# Altium integrated library Free Documents.IntLib: 42 symbols
Pins are listed as number, name and electrical type; pins without a type are passive.

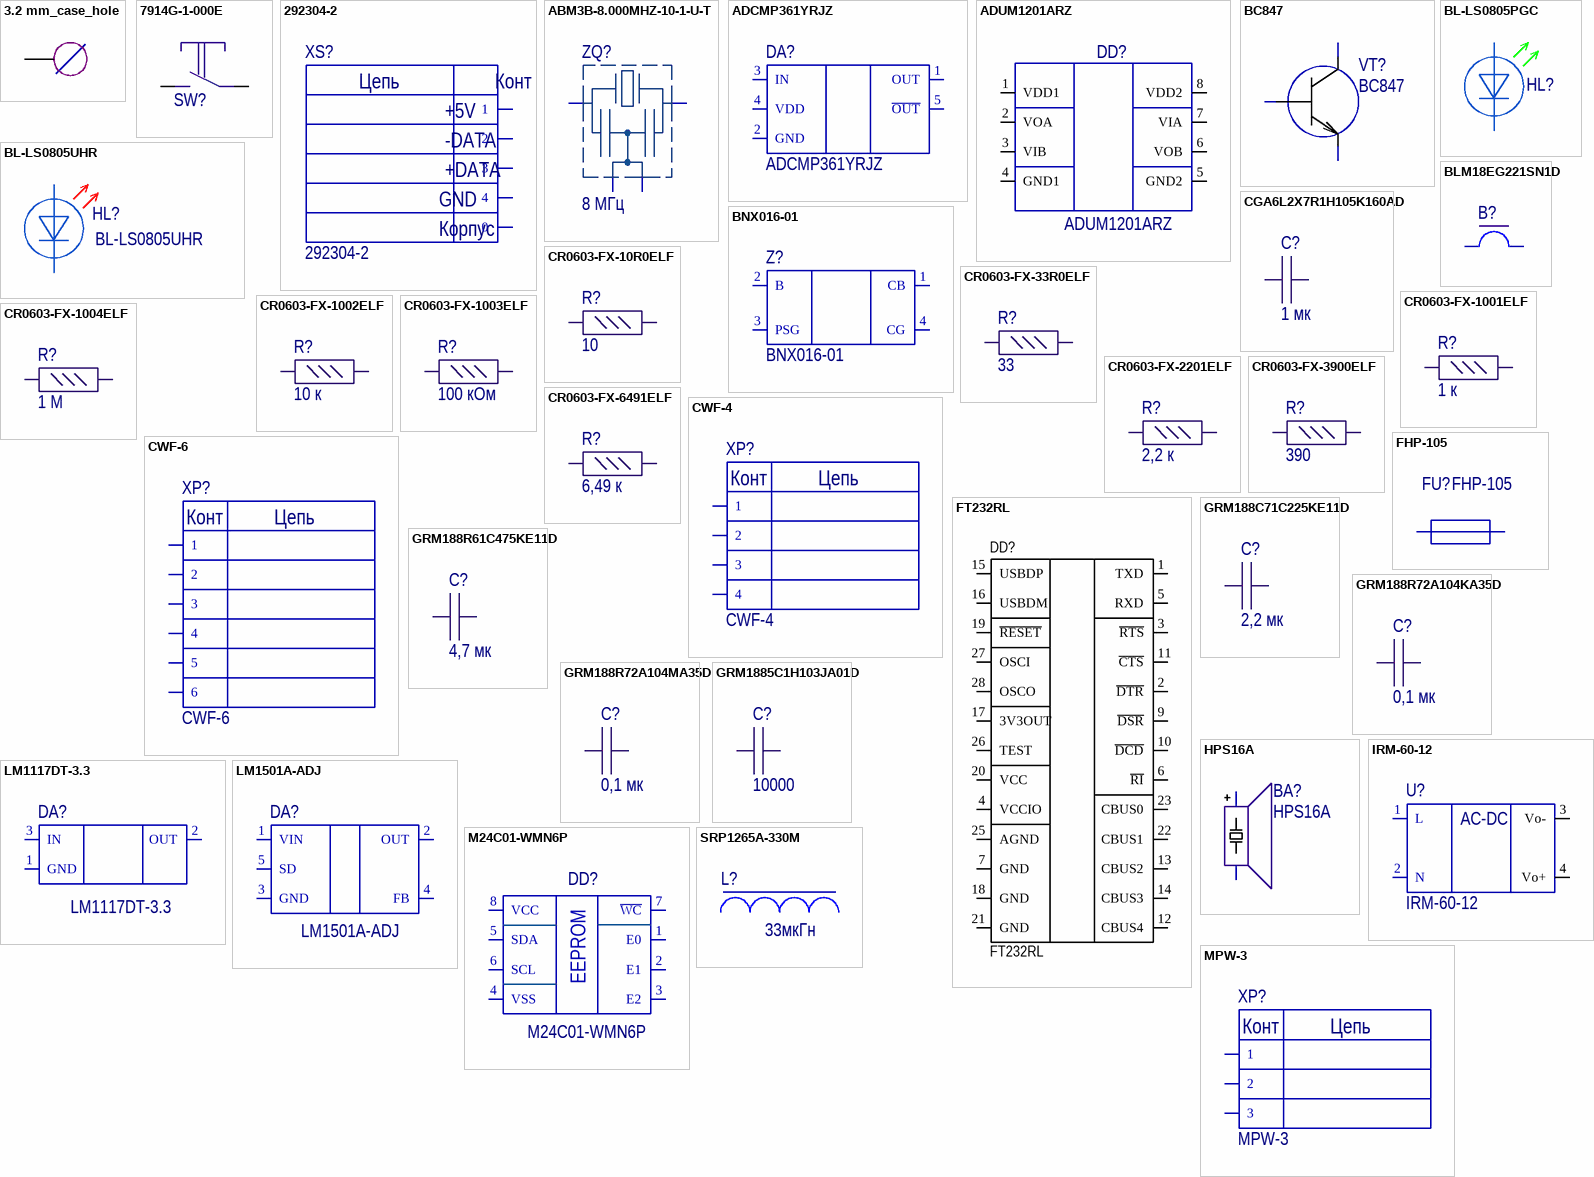
[diagram p0: symbols 3.2 mm_case_hole to SRP1265A-330M]

## 3.2 mm_case_hole
designator X?  (value not drawn)
footprint 3.2_Round_hole
pins: CASE

## 7914G-1-000E
designator SW?  (value not drawn)
Тактовый переключатель SMD
footprint 7914G
pins: 1, 2

## 292304-2
designator XS?
footprint USB-B
pins: 0, 1, 2, 3, 4
text: Цепь; Конт; +5V; -DATA; +DATA; GND; Корпус

## ABM3B-8.000MHZ-10-1-U-T
designator ZQ?, comment 8 МГц
footprint MJ CRYSTAL
pins: 1, 2, 3, 4

## ADCMP361YRJZ
designator DA?
GENERAL PURPOSE COMPARATOR
footprint SOT-23-5 (SOT23, 5-Leads, Body 2,90x2,80mm, Pitch 0,95mm, IPC Medium Density)
pins: 1 OUT, 2 GND, 3 IN, 4 VDD, 5 ~{OUT}

## ADUM1201ARZ
designator DD?
Двухканальный цифровой изолятор
footprint SO-8 (SOIC, 8-Leads, Body 4,90x3,90mm, Pitch 1,27mm, IPC Medium Density)
pins: 1 VDD1, 2 VOA, 3 VIB, 4 GND1, 5 GND2, 6 VOB, 7 VIA, 8 VDD2

## BC847
designator VT?
footprint SOT23 (SOT23, 3-Leads, Body 2,90x2,45mm, Pitch 0,95mm, IPC Medium Density)
pins: 1 B, 2 E, 3 C

## BL-LS0805PGC
designator HL?  (value not drawn)
footprint LED_0805_GREEN
pins: 1, 2

## BL-LS0805UHR
designator HL?
footprint LED_0805_RED
pins: 1, 2

## BLM18EG221SN1D
designator B?, comment 220 Ом  (value not drawn)
footprint BLM18
pins: 1, 2

## BNX016-01
designator Z?
25В 15А 40дБ, LC фильтр
footprint BNX01
pins: 1 CB, 2 B, 3 PSG, 4 CG

## CGA6L2X7R1H105K160AD
designator C?, comment 1 мк
CAP CER 1UF 50V X7R 1210 EPOXY; Part Number: CGA6L2X7R1H105K160AD; Manufacturer: TDK Corporation; Value: 1 мк; ComponentLink1URL: https://product.tdk.com/info/en/catalog/datasheets/mlcc_automotive_epoxy_en.pdf?ref_disty=digikey; ComponentLink1Description: Datasheet; Component Type: Capasitor
footprint C_1210
pins: 1, 2

## CR0603-FX-10R0ELF
designator R?, comment 10
RES SMD 10 OHM 1% 1/10W 0603; Part Number: CR0603-FX-10R0ELF; Manufacturer: Bourns Inc.; Value: 10; ComponentLink1URL: https://www.bourns.com/pdfs/chpreztr.pdf; ComponentLink1Description: Datasheet; Component Type: Resistor
footprint R_0603
pins: 1, 2

## CR0603-FX-33R0ELF
designator R?, comment 33
RES SMD 33 OHM 1% 1/10W 0603; Part Number: CR0603-FX-33R0ELF; Manufacturer: Bourns Inc.; Value: 33; ComponentLink1URL: https://www.bourns.com/pdfs/chpreztr.pdf; ComponentLink1Description: Datasheet; Component Type: Resistor
footprint R_0603
pins: 1, 2

## CR0603-FX-1001ELF
designator R?, comment 1 к
RES SMD 1K OHM 1% 1/10W 0603; Part Number: CR0603-FX-1001ELF; Manufacturer: Bourns Inc.; Value: 1 к; ComponentLink1URL: https://www.bourns.com/pdfs/chpreztr.pdf; ComponentLink1Description: Datasheet; Component Type: Resistor
footprint R_0603
pins: 1, 2

## CR0603-FX-1002ELF
designator R?, comment 10 к
RES SMD 10K OHM 1% 1/10W 0603; Part Number: CR0603-FX-1002ELF; Manufacturer: Bourns Inc.; Value: 10 к; ComponentLink1URL: https://www.bourns.com/pdfs/chpreztr.pdf; ComponentLink1Description: Datasheet; Component Type: Resistor
footprint R_0603
pins: 1, 2

## CR0603-FX-1003ELF
designator R?, comment 100 кОм
RES SMD 100K OHM 1% 1/10W 0603; Part Number: CR0603-FX-1003ELF; Manufacturer: Bourns Inc.; Value: 100 кОм; ComponentLink1URL: https://www.bourns.com/pdfs/chpreztr.pdf; ComponentLink1Description: Datasheet; Component Type: Resistor
footprint R_0603
pins: 1, 2

## CR0603-FX-1004ELF
designator R?, comment 1 M
RES SMD 1M OHM 1% 1/10W 0603; Part Number: CR0603-FX-1004ELF; Manufacturer: Bourns Inc.; Value: 1 M; ComponentLink1URL: https://www.bourns.com/pdfs/chpreztr.pdf; ComponentLink1Description: Datasheet; Component Type: Resistor
footprint R_0603
pins: 1, 2

## CR0603-FX-2201ELF
designator R?, comment 2,2 к
RES SMD 2.2K OHM 1% 1/10W 0603; Part Number: CR0603-FX-2201ELF; Manufacturer: Bourns Inc.; Value: 2,2 к; ComponentLink1URL: https://www.bourns.com/pdfs/chpreztr.pdf; ComponentLink1Description: Datasheet; Component Type: Resistor
footprint R_0603
pins: 1, 2

## CR0603-FX-3900ELF
designator R?, comment 390
RES SMD 390 OHM 1% 1/10W 0603; Part Number: CR0603-FX-3900ELF; Manufacturer: Bourns Inc.; Value: 390; ComponentLink1URL: https://www.bourns.com/pdfs/chpreztr.pdf; ComponentLink1Description: Datasheet; Component Type: Resistor
footprint R_0603
pins: 1, 2

## CR0603-FX-6491ELF
designator R?, comment 6,49 к
RES SMD 6.49K OHM 1% 1/10W 0603; Part Number: CR0603-FX-6491ELF; Manufacturer: Bourns Inc.; Value: 6,49 к; ComponentLink1URL: https://www.bourns.com/pdfs/chpreztr.pdf; ComponentLink1Description: Datasheet; Component Type: Resistor
footprint R_0603
pins: 1, 2

## CWF-4
designator XP?
footprint CWF-4
pins: 1, 2, 3, 4
text: Конт; Цепь

## CWF-6
designator XP?
footprint CWF-6
pins: 1, 2, 3, 4, 5, 6
text: Конт; Цепь

## FHP-105
designator FU?
footprint FHP-105
pins: 1, 2

## FT232RL
designator DD?
USB UART Asynchronous Serial Data Transfer Chip, SSOP-28, Pb-Free; PackageReference: SSOP-28 (MO-150-AH); PackageDescription: SOP, 28-Leads, Body 10,2x5,3mm (max), Pitch 0,65mm, IPC Low Density; Code_JEDEC: MO-150-AH; Temperature Range: *
footprint SSOP-28 (MO-150-AH) (SOP, 28-Leads, Body 10,2x5,3mm (max), Pitch 0,65mm, IPC Low Density)
footprint SSOP-28 (MO-150-AH) (SOP, 28-Leads, Body 10,2x5,3mm (max), Pitch 0,65mm, IPC Low Density)
pins: 1 TXD, 2 ~{DTR}, 3 ~{RTS}, 4 VCCIO, 5 RXD, 6 ~{RI}, 7 GND, 8 NC hidden, 9 ~{DSR}, 10 ~{DCD}, 11 ~{CTS}, 12 CBUS4, 13 CBUS2, 14 CBUS3, 15 USBDP, 16 USBDM, 17 3V3OUT, 18 GND, 19 ~{RESET}, 20 VCC, 21 GND, 22 CBUS1, 23 CBUS0, 24 NC hidden, 25 AGND, 26 TEST, 27 OSCI, 28 OSCO

## GRM188C71C225KE11D
designator C?, comment 2,2 мк
CAP CER 2.2UF 16V X7S 0603; Part Number: GRM188C71C225KE11D; Manufacturer: Murata Electronics; Value: 2.2µF; ComponentLink1URL: https://search.murata.co.jp/Ceramy/image/img/A01X/G101/ENG/GRM188C71C225KE11-01.pdf; ComponentLink1Description: Datasheet; Component Type: Capasitor
footprint C_0603
pins: 1, 2

## GRM188R61C475KE11D
designator C?, comment 4,7 мк
CAP CER 4.7UF 16V X5R 0603; Part Number: GRM188R61C475KE11D; Manufacturer: Murata Electronics; Value: 4.7µF; ComponentLink1URL: https://search.murata.co.jp/Ceramy/image/img/A01X/G101/ENG/GRM188R61C475KE11-01.pdf; ComponentLink1Description: Datasheet; Component Type: Capasitor
footprint C_0603
pins: 1, 2

## GRM188R72A104KA35D
designator C?, comment 0,1 мк
CAP CER 0.1UF 100V X7R 0603; Part Number: GRM188R72A104KA35D; Manufacturer: Murata Electronics; Value: 0.1µF; ComponentLink1URL: https://www.murata.com/~/media/webrenewal/support/library/catalog/products/capacitor/mlcc/c02e.ashx?la=en-us; ComponentLink1Description: Datasheet; Component Type: Capasitor
footprint C_0603
pins: 1, 2

## GRM188R72A104MA35D
designator C?, comment 0,1 мк
CAP CER 0.1UF 100V X7R 0603; Part Number: GRM188R72A104MA35D; Manufacturer: Murata Electronics; Value: 0.1µF; ComponentLink1URL: https://search.murata.co.jp/Ceramy/image/img/A01X/G101/ENG/GRM188R72A104MA35-01.pdf; ComponentLink1Description: Datasheet; Component Type: Capasitor
footprint C_0603
pins: 1, 2

## GRM1885C1H103JA01D
designator C?, comment 10000
CAP CER 10000PF 50V C0G/NP0 0603; Part Number: GRM1885C1H103JA01D; Manufacturer: Murata Electronics; Value: 10000pF; ComponentLink1URL: https://www.murata.com/~/media/webrenewal/support/library/catalog/products/capacitor/mlcc/c02e.ashx?la=en-us; ComponentLink1Description: Datasheet; Component Type: Capasitor
footprint C_0603
pins: 1, 2

## HPS16A
designator BA?
footprint HPS16A
pins: 1, 2

## IRM-60-12
designator U?
AC/DC преобразователь
footprint IRM-60-12
pins: 1 L, 2 N, 3 Vo-, 4 Vo+
text: AC-DC

## LM1117DT-3.3
designator DA?
HelpURL: https://static.chipdip.ru/lib/142/DOC000142693.pdf
footprint TO-252 (D-PAK, 3-Pads, Body 6,15x6,65mm (max), IPC Medium Density)
pins: 1 GND, 2 OUT, 3 IN

## LM1501A-ADJ
designator DA?
footprint to263-5
pins: 1 VIN, 2 OUT, 3 GND, 4 FB, 5 SD

## M24C01-WMN6P
designator DD?
EEPROM Serial-I2C, 1K-bit (128 x 8), 3.3V/5V [SO-8]
footprint SO-8 (SOIC, 8-Leads, Body 4,90x3,90mm, Pitch 1,27mm, IPC Medium Density)
pins: 1 E0, 2 E1, 3 E2, 4 VSS, 5 SDA, 6 SCL, 7 ~{WC}, 8 VCC
text: EEPROM

## MPW-3
designator XP?
footprint MPW-3
pins: 1, 2, 3
text: Конт; Цепь

## SRP1265A-330M
designator L?, comment 33мкГн
33мкГн 8А
footprint SRP1265A
pins: 1, 2

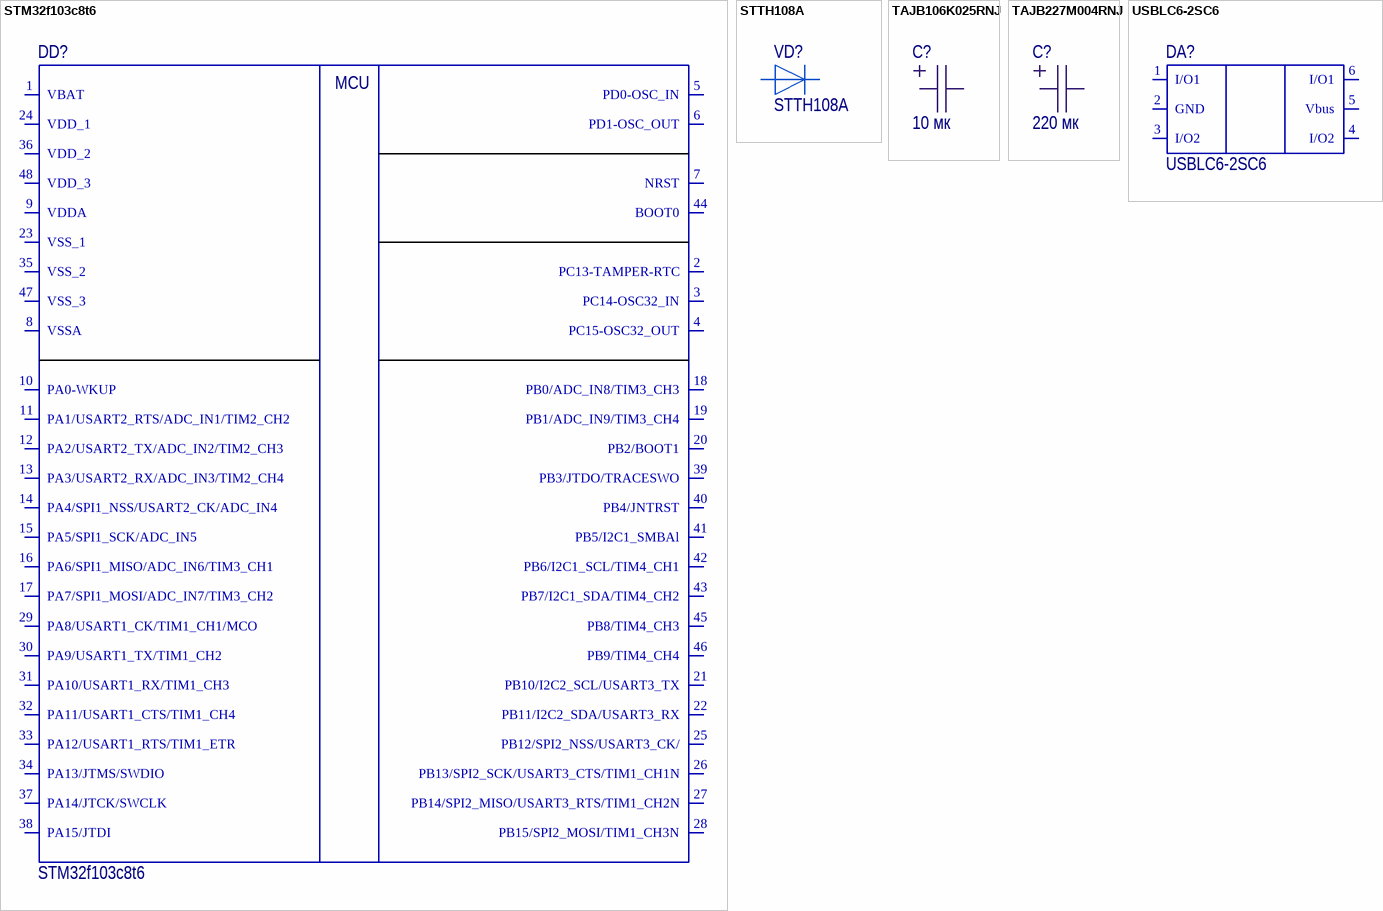
[diagram p1: symbols STM32f103c8t6 to USBLC6-2SC6]

## STM32f103c8t6
designator DD?
footprint LQFP48 (TSQFP, 48-Leads, Body 7,00x7,00mm, Pitch 0,50mm, IPC Medium Density)
pins: 1 VBAT, 2 PC13-TAMPER-RTC, 3 PC14-OSC32_IN, 4 PC15-OSC32_OUT, 5 PD0-OSC_IN, 6 PD1-OSC_OUT, 7 NRST, 8 VSSA, 9 VDDA, 10 PA0-WKUP, 11 PA1/USART2_RTS/ADC_IN1/TIM2_CH2, 12 PA2/USART2_TX/ADC_IN2/TIM2_CH3, 13 PA3/USART2_RX/ADC_IN3/TIM2_CH4, 14 PA4/SPI1_NSS/USART2_CK/ADC_IN4, 15 PA5/SPI1_SCK/ADC_IN5, 16 PA6/SPI1_MISO/ADC_IN6/TIM3_CH1, 17 PA7/SPI1_MOSI/ADC_IN7/TIM3_CH2, 18 PB0/ADC_IN8/TIM3_CH3, 19 PB1/ADC_IN9/TIM3_CH4, 20 PB2/BOOT1, 21 PB10/I2C2_SCL/USART3_TX, 22 PB11/I2C2_SDA/USART3_RX, 23 VSS_1, 24 VDD_1, 25 PB12/SPI2_NSS/USART3_CK/, 26 PB13/SPI2_SCK/USART3_CTS/TIM1_CH1N, 27 PB14/SPI2_MISO/USART3_RTS/TIM1_CH2N, 28 PB15/SPI2_MOSI/TIM1_CH3N, 29 PA8/USART1_CK/TIM1_CH1/MCO, 30 PA9/USART1_TX/TIM1_CH2, 31 PA10/USART1_RX/TIM1_CH3, 32 PA11/USART1_CTS/TIM1_CH4, 33 PA12/USART1_RTS/TIM1_ETR, 34 PA13/JTMS/SWDIO, 35 VSS_2, 36 VDD_2, 37 PA14/JTCK/SWCLK, 38 PA15/JTDI, 39 PB3/JTDO/TRACESWO, 40 PB4/JNTRST, 41 PB5/I2C1_SMBAl, 42 PB6/I2C1_SCL/TIM4_CH1, 43 PB7/I2C1_SDA/TIM4_CH2, 44 BOOT0, 45 PB8/TIM4_CH3, 46 PB9/TIM4_CH4, 47 VSS_3, 48 VDD_3
text: MCU

## STTH108A
designator VD?
Диод ULTRA FAST 1А 800В
footprint DO-214AC
pins: 1, 2

## TAJB106K025RNJ
designator C?, comment 10 мк
CAP TANT 10UF 10% 25V 1411; Part Number: TAJB106K025RNJ; Manufacturer: AVX Corporation; Value: 10µF; ComponentLink1URL: http://datasheets.avx.com/TAJ.pdf; ComponentLink1Description: Datasheet; Component Type: Tantalum Capacitor
footprint B_CASE
pins: 1, 2

## TAJB227M004RNJ
designator C?, comment 220 мк
CAP TANT 220UF 20% 4V 1411; Part Number: TAJB227M004RNJ; Manufacturer: AVX Corporation; Value: 220µF; ComponentLink1URL: http://datasheets.avx.com/TAJ.pdf; ComponentLink1Description: Datasheet; Component Type: Tantalum Capacitor
footprint B_CASE
pins: 1, 2

## USBLC6-2SC6
designator DA?
HelpURL: https://static.chipdip.ru/lib/093/DOC001093117.pdf
footprint SOT-23-6 (SOT23, 6-Leads, Body 1,60x1,60mm, Pitch 0,50mm, IPC Medium Density)
pins: 1 I/O1, 2 GND, 3 I/O2, 4 I/O2, 5 Vbus, 6 I/O1